# Altium schematic symbol library jlcpcb_2025_04_capacitors_extended_0402.schlib: 3594 symbols (part 3 of 20) (continued)
## 0402N120G500CT
designator C?  Capacitance: 12pF  (hidden comment: *)
Capacitor, Ceramic (MLCC), 12pF, ±2%, 50V, NP0, ±2%, SMD 0402; Manufacturer: Walsin Tech Corp; Manufacturer Part Number: 0402N120G500CT; Package Size: 0402; JLCPCB Basic Part: No; JLCPCB Part Number: C340649; Supplier 1: LCSC; Category: Capacitors - MLCC; Supplier Part Number 1: C340649; Tolerance: ±2%; Voltage Rating: 50V; Temperature Coefficient: NP0; RoHS: Yes; ComponentLink1Description: Datasheet; ComponentLink1URL: https://wmsc.lcsc.com/wmsc/upload/file/pdf/v2/lcsc/2304140030_Walsin-Tech-Corp-0402N120G500CT_C340649.pdf; ComponentLink2Description: JLCPCB Part URL; ComponentLink2URL: https://jlcpcb.com/partdetail/C340649; ComponentLink3Description: LCSC Part URL; ComponentLink3URL: https://lcsc.com/product-detail/Multilayer-Ceramic-Capacitors-MLCC---SMD-SMT_Walsin-Tech-Corp-Walsin-Tech-Corp-0402N120G500CT_C340649.html
footprint CAP-0402 (0402 (1005M) Capacitor)
pins: 1, 2

## 0402N120J500CT
designator C?  Capacitance: 12pF  (hidden comment: *)
Capacitor, Ceramic (MLCC), 12pF, ±5%, 50V, NP0, ±5%, SMD 0402; Manufacturer: Walsin Tech Corp; Manufacturer Part Number: 0402N120J500CT; Package Size: 0402; JLCPCB Basic Part: No; JLCPCB Part Number: C340641; Supplier 1: LCSC; Category: Capacitors - MLCC; Supplier Part Number 1: C340641; Tolerance: ±5%; Voltage Rating: 50V; Temperature Coefficient: NP0; RoHS: Yes; ComponentLink1Description: Datasheet; ComponentLink1URL: https://wmsc.lcsc.com/wmsc/upload/file/pdf/v2/lcsc/2304140030_Walsin-Tech-Corp-0402N120J500CT_C340641.pdf; ComponentLink2Description: JLCPCB Part URL; ComponentLink2URL: https://jlcpcb.com/partdetail/C340641; ComponentLink3Description: LCSC Part URL; ComponentLink3URL: https://lcsc.com/product-detail/Multilayer-Ceramic-Capacitors-MLCC---SMD-SMT_Walsin-Tech-Corp-Walsin-Tech-Corp-0402N120J500CT_C340641.html
footprint CAP-0402 (0402 (1005M) Capacitor)
pins: 1, 2

## 0402N120K500CT
designator C?  Capacitance: 12pF  (hidden comment: *)
Capacitor, Ceramic (MLCC), 12pF, ±10%, 50V, NP0, ±10%, SMD 0402; Manufacturer: Walsin Tech Corp; Manufacturer Part Number: 0402N120K500CT; Package Size: 0402; JLCPCB Basic Part: No; JLCPCB Part Number: C295958; Supplier 1: LCSC; Category: Capacitors - MLCC; Supplier Part Number 1: C295958; Tolerance: ±10%; Voltage Rating: 50V; Temperature Coefficient: NP0; RoHS: Yes; ComponentLink1Description: Datasheet; ComponentLink1URL: https://wmsc.lcsc.com/wmsc/upload/file/pdf/v2/lcsc/2304140030_Walsin-Tech-Corp-0402N120K500CT_C295958.pdf; ComponentLink2Description: JLCPCB Part URL; ComponentLink2URL: https://jlcpcb.com/partdetail/C295958; ComponentLink3Description: LCSC Part URL; ComponentLink3URL: https://lcsc.com/product-detail/Multilayer-Ceramic-Capacitors-MLCC---SMD-SMT_Walsin-Tech-Corp-Walsin-Tech-Corp-0402N120K500CT_C295958.html
footprint CAP-0402 (0402 (1005M) Capacitor)
pins: 1, 2

## 0402N121F500CT
designator C?  Capacitance: 120pF  (hidden comment: *)
Capacitor, Ceramic (MLCC), 120pF, ±1%, 50V, NP0, ±1%, SMD 0402; Manufacturer: Walsin Tech Corp; Manufacturer Part Number: 0402N121F500CT; Package Size: 0402; JLCPCB Basic Part: No; JLCPCB Part Number: C2443241; Supplier 1: LCSC; Category: Capacitors - MLCC; Supplier Part Number 1: C2443241; Tolerance: ±1%; Voltage Rating: 50V; Temperature Coefficient: NP0; RoHS: Yes; ComponentLink1Description: Datasheet; ComponentLink1URL: https://wmsc.lcsc.com/wmsc/upload/file/pdf/v2/lcsc/2309201533_Walsin-Tech-Corp-0402N121F500CT_C2443241.pdf; ComponentLink2Description: JLCPCB Part URL; ComponentLink2URL: https://jlcpcb.com/partdetail/C2443241; ComponentLink3Description: LCSC Part URL; ComponentLink3URL: https://lcsc.com/product-detail/Multilayer-Ceramic-Capacitors-MLCC---SMD-SMT_Walsin-Tech-Corp-Walsin-Tech-Corp-0402N121F500CT_C2443241.html
footprint CAP-0402 (0402 (1005M) Capacitor)
pins: 1, 2

## 0402N121G500CT
designator C?  Capacitance: 120pF  (hidden comment: *)
Capacitor, Ceramic (MLCC), 120pF, ±2%, 50V, NP0, ±2%, SMD 0402; Manufacturer: Walsin Tech Corp; Manufacturer Part Number: 0402N121G500CT; Package Size: 0402; JLCPCB Basic Part: No; JLCPCB Part Number: C396705; Supplier 1: LCSC; Category: Capacitors - MLCC; Supplier Part Number 1: C396705; Tolerance: ±2%; Voltage Rating: 50V; Temperature Coefficient: NP0; RoHS: Yes; ComponentLink1Description: Datasheet; ComponentLink1URL: https://wmsc.lcsc.com/wmsc/upload/file/pdf/v2/lcsc/2304140030_Walsin-Tech-Corp-0402N121G500CT_C396705.pdf; ComponentLink2Description: JLCPCB Part URL; ComponentLink2URL: https://jlcpcb.com/partdetail/C396705; ComponentLink3Description: LCSC Part URL; ComponentLink3URL: https://lcsc.com/product-detail/Multilayer-Ceramic-Capacitors-MLCC---SMD-SMT_Walsin-Tech-Corp-Walsin-Tech-Corp-0402N121G500CT_C396705.html
footprint CAP-0402 (0402 (1005M) Capacitor)
pins: 1, 2

## 0402N121J500CT
designator C?  Capacitance: 120pF  (hidden comment: *)
Capacitor, Ceramic (MLCC), 120pF, ±5%, 50V, NP0, ±5%, SMD 0402; Manufacturer: Walsin Tech Corp; Manufacturer Part Number: 0402N121J500CT; Package Size: 0402; JLCPCB Basic Part: No; JLCPCB Part Number: C237176; Supplier 1: LCSC; Category: Capacitors - MLCC; Supplier Part Number 1: C237176; Tolerance: ±5%; Voltage Rating: 50V; Temperature Coefficient: NP0; RoHS: Yes; ComponentLink1Description: Datasheet; ComponentLink1URL: https://wmsc.lcsc.com/wmsc/upload/file/pdf/v2/lcsc/2304140030_Walsin-Tech-Corp-0402N121J500CT_C237176.pdf; ComponentLink2Description: JLCPCB Part URL; ComponentLink2URL: https://jlcpcb.com/partdetail/C237176; ComponentLink3Description: LCSC Part URL; ComponentLink3URL: https://lcsc.com/product-detail/Multilayer-Ceramic-Capacitors-MLCC---SMD-SMT_Walsin-Tech-Corp-Walsin-Tech-Corp-0402N121J500CT_C237176.html
footprint CAP-0402 (0402 (1005M) Capacitor)
pins: 1, 2

## 0402N130J500CT
designator C?  Capacitance: 13pF  (hidden comment: *)
Capacitor, Ceramic (MLCC), 13pF, ±5%, 50V, NP0, ±5%, SMD 0402; Manufacturer: Walsin Tech Corp; Manufacturer Part Number: 0402N130J500CT; Package Size: 0402; JLCPCB Basic Part: No; JLCPCB Part Number: C301963; Supplier 1: LCSC; Category: Capacitors - MLCC; Supplier Part Number 1: C301963; Tolerance: ±5%; Voltage Rating: 50V; Temperature Coefficient: NP0; RoHS: Yes; ComponentLink1Description: Datasheet; ComponentLink1URL: https://wmsc.lcsc.com/wmsc/upload/file/pdf/v2/lcsc/2304140030_Walsin-Tech-Corp-0402N130J500CT_C301963.pdf; ComponentLink2Description: JLCPCB Part URL; ComponentLink2URL: https://jlcpcb.com/partdetail/C301963; ComponentLink3Description: LCSC Part URL; ComponentLink3URL: https://lcsc.com/product-detail/Multilayer-Ceramic-Capacitors-MLCC---SMD-SMT_Walsin-Tech-Corp-Walsin-Tech-Corp-0402N130J500CT_C301963.html
footprint CAP-0402 (0402 (1005M) Capacitor)
pins: 1, 2

## 0402N140J500CT
designator C?  Capacitance: 14pF  (hidden comment: *)
Capacitor, Ceramic (MLCC), 14pF, ±5%, 50V, NP0, ±5%, SMD 0402; Manufacturer: Walsin Tech Corp; Manufacturer Part Number: 0402N140J500CT; Package Size: 0402; JLCPCB Basic Part: No; JLCPCB Part Number: C458857; Supplier 1: LCSC; Category: Capacitors - MLCC; Supplier Part Number 1: C458857; Tolerance: ±5%; Voltage Rating: 50V; Temperature Coefficient: NP0; RoHS: Yes; ComponentLink1Description: Datasheet; ComponentLink1URL: https://wmsc.lcsc.com/wmsc/upload/file/pdf/v2/lcsc/2304140030_Walsin-Tech-Corp-0402N140J500CT_C458857.pdf; ComponentLink2Description: JLCPCB Part URL; ComponentLink2URL: https://jlcpcb.com/partdetail/C458857; ComponentLink3Description: LCSC Part URL; ComponentLink3URL: https://lcsc.com/product-detail/Multilayer-Ceramic-Capacitors-MLCC---SMD-SMT_Walsin-Tech-Corp-Walsin-Tech-Corp-0402N140J500CT_C458857.html
footprint CAP-0402 (0402 (1005M) Capacitor)
pins: 1, 2

## 0402N150F500CT
designator C?  Capacitance: 15pF  (hidden comment: *)
Capacitor, Ceramic (MLCC), 15pF, ±1%, 50V, NP0, ±1%, SMD 0402; Manufacturer: Walsin Tech Corp; Manufacturer Part Number: 0402N150F500CT; Package Size: 0402; JLCPCB Basic Part: No; JLCPCB Part Number: C396706; Supplier 1: LCSC; Category: Capacitors - MLCC; Supplier Part Number 1: C396706; Tolerance: ±1%; Voltage Rating: 50V; Temperature Coefficient: NP0; RoHS: Yes; ComponentLink1Description: Datasheet; ComponentLink1URL: https://wmsc.lcsc.com/wmsc/upload/file/pdf/v2/lcsc/2304140030_Walsin-Tech-Corp-0402N150F500CT_C396706.pdf; ComponentLink2Description: JLCPCB Part URL; ComponentLink2URL: https://jlcpcb.com/partdetail/C396706; ComponentLink3Description: LCSC Part URL; ComponentLink3URL: https://lcsc.com/product-detail/Multilayer-Ceramic-Capacitors-MLCC---SMD-SMT_Walsin-Tech-Corp-Walsin-Tech-Corp-0402N150F500CT_C396706.html
footprint CAP-0402 (0402 (1005M) Capacitor)
pins: 1, 2

## 0402N150G500CT
designator C?  Capacitance: 15pF  (hidden comment: *)
Capacitor, Ceramic (MLCC), 15pF, ±2%, 50V, NP0, ±2%, SMD 0402; Manufacturer: Walsin Tech Corp; Manufacturer Part Number: 0402N150G500CT; Package Size: 0402; JLCPCB Basic Part: No; JLCPCB Part Number: C387970; Supplier 1: LCSC; Category: Capacitors - MLCC; Supplier Part Number 1: C387970; Tolerance: ±2%; Voltage Rating: 50V; Temperature Coefficient: NP0; RoHS: Yes; ComponentLink1Description: Datasheet; ComponentLink1URL: https://wmsc.lcsc.com/wmsc/upload/file/pdf/v2/lcsc/2304140030_Walsin-Tech-Corp-0402N150G500CT_C387970.pdf; ComponentLink2Description: JLCPCB Part URL; ComponentLink2URL: https://jlcpcb.com/partdetail/C387970; ComponentLink3Description: LCSC Part URL; ComponentLink3URL: https://lcsc.com/product-detail/Multilayer-Ceramic-Capacitors-MLCC---SMD-SMT_Walsin-Tech-Corp-Walsin-Tech-Corp-0402N150G500CT_C387970.html
footprint CAP-0402 (0402 (1005M) Capacitor)
pins: 1, 2

## 0402N150J500CT
designator C?  Capacitance: 15pF  (hidden comment: *)
Capacitor, Ceramic (MLCC), 15pF, ±5%, 50V, NP0, ±5%, SMD 0402; Manufacturer: Walsin Tech Corp; Manufacturer Part Number: 0402N150J500CT; Package Size: 0402; JLCPCB Basic Part: No; JLCPCB Part Number: C387971; Supplier 1: LCSC; Category: Capacitors - MLCC; Supplier Part Number 1: C387971; Tolerance: ±5%; Voltage Rating: 50V; Temperature Coefficient: NP0; RoHS: Yes; ComponentLink1Description: Datasheet; ComponentLink1URL: https://wmsc.lcsc.com/wmsc/upload/file/pdf/v2/lcsc/2304140030_Walsin-Tech-Corp-0402N150J500CT_C387971.pdf; ComponentLink2Description: JLCPCB Part URL; ComponentLink2URL: https://jlcpcb.com/partdetail/C387971; ComponentLink3Description: LCSC Part URL; ComponentLink3URL: https://lcsc.com/product-detail/Multilayer-Ceramic-Capacitors-MLCC---SMD-SMT_Walsin-Tech-Corp-Walsin-Tech-Corp-0402N150J500CT_C387971.html
footprint CAP-0402 (0402 (1005M) Capacitor)
pins: 1, 2

## 0402N150K500CT
designator C?  Capacitance: 15pF  (hidden comment: *)
Capacitor, Ceramic (MLCC), 15pF, ±10%, 50V, NP0, ±10%, SMD 0402; Manufacturer: Walsin Tech Corp; Manufacturer Part Number: 0402N150K500CT; Package Size: 0402; JLCPCB Basic Part: No; JLCPCB Part Number: C295959; Supplier 1: LCSC; Category: Capacitors - MLCC; Supplier Part Number 1: C295959; Tolerance: ±10%; Voltage Rating: 50V; Temperature Coefficient: NP0; RoHS: Yes; ComponentLink1Description: Datasheet; ComponentLink1URL: https://wmsc.lcsc.com/wmsc/upload/file/pdf/v2/lcsc/2304140030_Walsin-Tech-Corp-0402N150K500CT_C295959.pdf; ComponentLink2Description: JLCPCB Part URL; ComponentLink2URL: https://jlcpcb.com/partdetail/C295959; ComponentLink3Description: LCSC Part URL; ComponentLink3URL: https://lcsc.com/product-detail/Multilayer-Ceramic-Capacitors-MLCC---SMD-SMT_Walsin-Tech-Corp-Walsin-Tech-Corp-0402N150K500CT_C295959.html
footprint CAP-0402 (0402 (1005M) Capacitor)
pins: 1, 2

## 0402N151J500CT
designator C?  Capacitance: 150pF  (hidden comment: *)
Capacitor, Ceramic (MLCC), 150pF, ±5%, 50V, NP0, ±5%, SMD 0402; Manufacturer: Walsin Tech Corp; Manufacturer Part Number: 0402N151J500CT; Package Size: 0402; JLCPCB Basic Part: No; JLCPCB Part Number: C301964; Supplier 1: LCSC; Category: Capacitors - MLCC; Supplier Part Number 1: C301964; Tolerance: ±5%; Voltage Rating: 50V; Temperature Coefficient: NP0; RoHS: Yes; ComponentLink1Description: Datasheet; ComponentLink1URL: https://wmsc.lcsc.com/wmsc/upload/file/pdf/v2/lcsc/2304140030_Walsin-Tech-Corp-0402N151J500CT_C301964.pdf; ComponentLink2Description: JLCPCB Part URL; ComponentLink2URL: https://jlcpcb.com/partdetail/C301964; ComponentLink3Description: LCSC Part URL; ComponentLink3URL: https://lcsc.com/product-detail/Multilayer-Ceramic-Capacitors-MLCC---SMD-SMT_Walsin-Tech-Corp-Walsin-Tech-Corp-0402N151J500CT_C301964.html
footprint CAP-0402 (0402 (1005M) Capacitor)
pins: 1, 2

## 0402N151K500CT
designator C?  Capacitance: 150pF  (hidden comment: *)
Capacitor, Ceramic (MLCC), 150pF, ±10%, 50V, NP0, ±10%, SMD 0402; Manufacturer: Walsin Tech Corp; Manufacturer Part Number: 0402N151K500CT; Package Size: 0402; JLCPCB Basic Part: No; JLCPCB Part Number: C295960; Supplier 1: LCSC; Category: Capacitors - MLCC; Supplier Part Number 1: C295960; Tolerance: ±10%; Voltage Rating: 50V; Temperature Coefficient: NP0; RoHS: Yes; ComponentLink1Description: Datasheet; ComponentLink1URL: https://wmsc.lcsc.com/wmsc/upload/file/pdf/v2/lcsc/2304140030_Walsin-Tech-Corp-0402N151K500CT_C295960.pdf; ComponentLink2Description: JLCPCB Part URL; ComponentLink2URL: https://jlcpcb.com/partdetail/C295960; ComponentLink3Description: LCSC Part URL; ComponentLink3URL: https://lcsc.com/product-detail/Multilayer-Ceramic-Capacitors-MLCC---SMD-SMT_Walsin-Tech-Corp-Walsin-Tech-Corp-0402N151K500CT_C295960.html
footprint CAP-0402 (0402 (1005M) Capacitor)
pins: 1, 2

## 0402N160J500CT
designator C?  Capacitance: 16pF  (hidden comment: *)
Capacitor, Ceramic (MLCC), 16pF, ±5%, 50V, NP0, ±5%, SMD 0402; Manufacturer: Walsin Tech Corp; Manufacturer Part Number: 0402N160J500CT; Package Size: 0402; JLCPCB Basic Part: No; JLCPCB Part Number: C237184; Supplier 1: LCSC; Category: Capacitors - MLCC; Supplier Part Number 1: C237184; Tolerance: ±5%; Voltage Rating: 50V; Temperature Coefficient: NP0; RoHS: Yes; ComponentLink1Description: Datasheet; ComponentLink1URL: https://wmsc.lcsc.com/wmsc/upload/file/pdf/v2/lcsc/2304140030_Walsin-Tech-Corp-0402N160J500CT_C237184.pdf; ComponentLink2Description: JLCPCB Part URL; ComponentLink2URL: https://jlcpcb.com/partdetail/C237184; ComponentLink3Description: LCSC Part URL; ComponentLink3URL: https://lcsc.com/product-detail/Multilayer-Ceramic-Capacitors-MLCC---SMD-SMT_Walsin-Tech-Corp-Walsin-Tech-Corp-0402N160J500CT_C237184.html
footprint CAP-0402 (0402 (1005M) Capacitor)
pins: 1, 2

## 0402N161J500
designator C?  Capacitance: 160pF  (hidden comment: *)
Capacitor, Ceramic (MLCC), 160pF, ±5%, 50V, NP0, ±5%, SMD 0402; Manufacturer: Walsin Tech Corp; Manufacturer Part Number: 0402N161J500; Package Size: 0402; JLCPCB Basic Part: No; JLCPCB Part Number: C152786; Supplier 1: LCSC; Category: Capacitors - MLCC; Supplier Part Number 1: C152786; Tolerance: ±5%; Voltage Rating: 50V; Temperature Coefficient: NP0; RoHS: Yes; ComponentLink1Description: Datasheet; ComponentLink1URL: https://wmsc.lcsc.com/wmsc/upload/file/pdf/v2/lcsc/2304140030_Walsin-Tech-Corp-0402N161J500_C152786.pdf; ComponentLink2Description: JLCPCB Part URL; ComponentLink2URL: https://jlcpcb.com/partdetail/C152786; ComponentLink3Description: LCSC Part URL; ComponentLink3URL: https://lcsc.com/product-detail/Multilayer-Ceramic-Capacitors-MLCC---SMD-SMT_Walsin-Tech-Corp-Walsin-Tech-Corp-0402N161J500_C152786.html
footprint CAP-0402 (0402 (1005M) Capacitor)
pins: 1, 2

## 0402N180G500CT
designator C?  Capacitance: 18pF  (hidden comment: *)
Capacitor, Ceramic (MLCC), 18pF, ±2%, 50V, NP0, ±2%, SMD 0402; Manufacturer: Walsin Tech Corp; Manufacturer Part Number: 0402N180G500CT; Package Size: 0402; JLCPCB Basic Part: No; JLCPCB Part Number: C555395; Supplier 1: LCSC; Category: Capacitors - MLCC; Supplier Part Number 1: C555395; Tolerance: ±2%; Voltage Rating: 50V; Temperature Coefficient: NP0; RoHS: Yes; ComponentLink1Description: Datasheet; ComponentLink1URL: https://wmsc.lcsc.com/wmsc/upload/file/pdf/v2/lcsc/2304140030_Walsin-Tech-Corp-0402N180G500CT_C555395.pdf; ComponentLink2Description: JLCPCB Part URL; ComponentLink2URL: https://jlcpcb.com/partdetail/C555395; ComponentLink3Description: LCSC Part URL; ComponentLink3URL: https://lcsc.com/product-detail/Multilayer-Ceramic-Capacitors-MLCC---SMD-SMT_Walsin-Tech-Corp-Walsin-Tech-Corp-0402N180G500CT_C555395.html
footprint CAP-0402 (0402 (1005M) Capacitor)
pins: 1, 2

## 0402N180J500CT
designator C?  Capacitance: 18pF  (hidden comment: *)
Capacitor, Ceramic (MLCC), 18pF, ±5%, 50V, NP0, ±5%, SMD 0402; Manufacturer: Walsin Tech Corp; Manufacturer Part Number: 0402N180J500CT; Package Size: 0402; JLCPCB Basic Part: No; JLCPCB Part Number: C338135; Supplier 1: LCSC; Category: Capacitors - MLCC; Supplier Part Number 1: C338135; Tolerance: ±5%; Voltage Rating: 50V; Temperature Coefficient: NP0; RoHS: Yes; ComponentLink1Description: Datasheet; ComponentLink1URL: https://wmsc.lcsc.com/wmsc/upload/file/pdf/v2/lcsc/2304140030_Walsin-Tech-Corp-0402N180J500CT_C338135.pdf; ComponentLink2Description: JLCPCB Part URL; ComponentLink2URL: https://jlcpcb.com/partdetail/C338135; ComponentLink3Description: LCSC Part URL; ComponentLink3URL: https://lcsc.com/product-detail/Multilayer-Ceramic-Capacitors-MLCC---SMD-SMT_Walsin-Tech-Corp-Walsin-Tech-Corp-0402N180J500CT_C338135.html
footprint CAP-0402 (0402 (1005M) Capacitor)
pins: 1, 2

## 0402N180K500CT
designator C?  Capacitance: 18pF  (hidden comment: *)
Capacitor, Ceramic (MLCC), 18pF, ±10%, 50V, NP0, ±10%, SMD 0402; Manufacturer: Walsin Tech Corp; Manufacturer Part Number: 0402N180K500CT; Package Size: 0402; JLCPCB Basic Part: No; JLCPCB Part Number: C295961; Supplier 1: LCSC; Category: Capacitors - MLCC; Supplier Part Number 1: C295961; Tolerance: ±10%; Voltage Rating: 50V; Temperature Coefficient: NP0; RoHS: Yes; ComponentLink1Description: Datasheet; ComponentLink1URL: https://wmsc.lcsc.com/wmsc/upload/file/pdf/v2/lcsc/2304140030_Walsin-Tech-Corp-0402N180K500CT_C295961.pdf; ComponentLink2Description: JLCPCB Part URL; ComponentLink2URL: https://jlcpcb.com/partdetail/C295961; ComponentLink3Description: LCSC Part URL; ComponentLink3URL: https://lcsc.com/product-detail/Multilayer-Ceramic-Capacitors-MLCC---SMD-SMT_Walsin-Tech-Corp-Walsin-Tech-Corp-0402N180K500CT_C295961.html
footprint CAP-0402 (0402 (1005M) Capacitor)
pins: 1, 2

## 0402N181F500CT
designator C?  Capacitance: 180pF  (hidden comment: *)
Capacitor, Ceramic (MLCC), 180pF, ±1%, 50V, NP0, ±1%, SMD 0402; Manufacturer: Walsin Tech Corp; Manufacturer Part Number: 0402N181F500CT; Package Size: 0402; JLCPCB Basic Part: No; JLCPCB Part Number: C387973; Supplier 1: LCSC; Category: Capacitors - MLCC; Supplier Part Number 1: C387973; Tolerance: ±1%; Voltage Rating: 50V; Temperature Coefficient: NP0; RoHS: Yes; ComponentLink1Description: Datasheet; ComponentLink1URL: https://wmsc.lcsc.com/wmsc/upload/file/pdf/v2/lcsc/2304140030_Walsin-Tech-Corp-0402N181F500CT_C387973.pdf; ComponentLink2Description: JLCPCB Part URL; ComponentLink2URL: https://jlcpcb.com/partdetail/C387973; ComponentLink3Description: LCSC Part URL; ComponentLink3URL: https://lcsc.com/product-detail/Multilayer-Ceramic-Capacitors-MLCC---SMD-SMT_Walsin-Tech-Corp-Walsin-Tech-Corp-0402N181F500CT_C387973.html
footprint CAP-0402 (0402 (1005M) Capacitor)
pins: 1, 2

## 0402N181K500CT
designator C?  Capacitance: 180pF  (hidden comment: *)
Capacitor, Ceramic (MLCC), 180pF, ±10%, 50V, NP0, ±10%, SMD 0402; Manufacturer: Walsin Tech Corp; Manufacturer Part Number: 0402N181K500CT; Package Size: 0402; JLCPCB Basic Part: No; JLCPCB Part Number: C295963; Supplier 1: LCSC; Category: Capacitors - MLCC; Supplier Part Number 1: C295963; Tolerance: ±10%; Voltage Rating: 50V; Temperature Coefficient: NP0; RoHS: Yes; ComponentLink1Description: Datasheet; ComponentLink1URL: https://wmsc.lcsc.com/wmsc/upload/file/pdf/v2/lcsc/2304140030_Walsin-Tech-Corp-0402N181K500CT_C295963.pdf; ComponentLink2Description: JLCPCB Part URL; ComponentLink2URL: https://jlcpcb.com/partdetail/C295963; ComponentLink3Description: LCSC Part URL; ComponentLink3URL: https://lcsc.com/product-detail/Multilayer-Ceramic-Capacitors-MLCC---SMD-SMT_Walsin-Tech-Corp-Walsin-Tech-Corp-0402N181K500CT_C295963.html
footprint CAP-0402 (0402 (1005M) Capacitor)
pins: 1, 2

## 0402N200F500CT
designator C?  Capacitance: 20pF  (hidden comment: *)
Capacitor, Ceramic (MLCC), 20pF, ±1%, 50V, NP0, ±1%, SMD 0402; Manufacturer: Walsin Tech Corp; Manufacturer Part Number: 0402N200F500CT; Package Size: 0402; JLCPCB Basic Part: No; JLCPCB Part Number: C295965; Supplier 1: LCSC; Category: Capacitors - MLCC; Supplier Part Number 1: C295965; Tolerance: ±1%; Voltage Rating: 50V; Temperature Coefficient: NP0; RoHS: Yes; ComponentLink1Description: Datasheet; ComponentLink1URL: https://wmsc.lcsc.com/wmsc/upload/file/pdf/v2/lcsc/2304140030_Walsin-Tech-Corp-0402N200F500CT_C295965.pdf; ComponentLink2Description: JLCPCB Part URL; ComponentLink2URL: https://jlcpcb.com/partdetail/C295965; ComponentLink3Description: LCSC Part URL; ComponentLink3URL: https://lcsc.com/product-detail/Multilayer-Ceramic-Capacitors-MLCC---SMD-SMT_Walsin-Tech-Corp-Walsin-Tech-Corp-0402N200F500CT_C295965.html
footprint CAP-0402 (0402 (1005M) Capacitor)
pins: 1, 2

## 0402N200G500CT
designator C?  Capacitance: 20pF  (hidden comment: *)
Capacitor, Ceramic (MLCC), 20pF, ±2%, 50V, NP0, ±2%, SMD 0402; Manufacturer: Walsin Tech Corp; Manufacturer Part Number: 0402N200G500CT; Package Size: 0402; JLCPCB Basic Part: No; JLCPCB Part Number: C469636; Supplier 1: LCSC; Category: Capacitors - MLCC; Supplier Part Number 1: C469636; Tolerance: ±2%; Voltage Rating: 50V; Temperature Coefficient: NP0; RoHS: Yes; ComponentLink1Description: Datasheet; ComponentLink1URL: https://wmsc.lcsc.com/wmsc/upload/file/pdf/v2/lcsc/2304140030_Walsin-Tech-Corp-0402N200G500CT_C469636.pdf; ComponentLink2Description: JLCPCB Part URL; ComponentLink2URL: https://jlcpcb.com/partdetail/C469636; ComponentLink3Description: LCSC Part URL; ComponentLink3URL: https://lcsc.com/product-detail/Multilayer-Ceramic-Capacitors-MLCC---SMD-SMT_Walsin-Tech-Corp-Walsin-Tech-Corp-0402N200G500CT_C469636.html
footprint CAP-0402 (0402 (1005M) Capacitor)
pins: 1, 2

## 0402N200J500CT
designator C?  Capacitance: 20pF  (hidden comment: *)
Capacitor, Ceramic (MLCC), 20pF, ±5%, 50V, NP0, ±5%, SMD 0402; Manufacturer: Walsin Tech Corp; Manufacturer Part Number: 0402N200J500CT; Package Size: 0402; JLCPCB Basic Part: No; JLCPCB Part Number: C123468; Supplier 1: LCSC; Category: Capacitors - MLCC; Supplier Part Number 1: C123468; Tolerance: ±5%; Voltage Rating: 50V; Temperature Coefficient: NP0; RoHS: Yes; ComponentLink1Description: Datasheet; ComponentLink1URL: https://wmsc.lcsc.com/wmsc/upload/file/pdf/v2/lcsc/2304140030_Walsin-Tech-Corp-0402N200J500CT_C123468.pdf; ComponentLink2Description: JLCPCB Part URL; ComponentLink2URL: https://jlcpcb.com/partdetail/C123468; ComponentLink3Description: LCSC Part URL; ComponentLink3URL: https://lcsc.com/product-detail/Multilayer-Ceramic-Capacitors-MLCC---SMD-SMT_Walsin-Tech-Corp-Walsin-Tech-Corp-0402N200J500CT_C123468.html
footprint CAP-0402 (0402 (1005M) Capacitor)
pins: 1, 2

## 0402N201F500CT
designator C?  Capacitance: 200pF  (hidden comment: *)
Capacitor, Ceramic (MLCC), 200pF, ±1%, 50V, NP0, ±1%, SMD 0402; Manufacturer: Walsin Tech Corp; Manufacturer Part Number: 0402N201F500CT; Package Size: 0402; JLCPCB Basic Part: No; JLCPCB Part Number: C301972; Supplier 1: LCSC; Category: Capacitors - MLCC; Supplier Part Number 1: C301972; Tolerance: ±1%; Voltage Rating: 50V; Temperature Coefficient: NP0; RoHS: Yes; ComponentLink1Description: Datasheet; ComponentLink1URL: https://wmsc.lcsc.com/wmsc/upload/file/pdf/v2/lcsc/2304140030_Walsin-Tech-Corp-0402N201F500CT_C301972.pdf; ComponentLink2Description: JLCPCB Part URL; ComponentLink2URL: https://jlcpcb.com/partdetail/C301972; ComponentLink3Description: LCSC Part URL; ComponentLink3URL: https://lcsc.com/product-detail/Multilayer-Ceramic-Capacitors-MLCC---SMD-SMT_Walsin-Tech-Corp-Walsin-Tech-Corp-0402N201F500CT_C301972.html
footprint CAP-0402 (0402 (1005M) Capacitor)
pins: 1, 2

## 0402N201J500CT
designator C?  Capacitance: 200pF  (hidden comment: *)
Capacitor, Ceramic (MLCC), 200pF, ±5%, 50V, NP0, ±5%, SMD 0402; Manufacturer: Walsin Tech Corp; Manufacturer Part Number: 0402N201J500CT; Package Size: 0402; JLCPCB Basic Part: No; JLCPCB Part Number: C295967; Supplier 1: LCSC; Category: Capacitors - MLCC; Supplier Part Number 1: C295967; Tolerance: ±5%; Voltage Rating: 50V; Temperature Coefficient: NP0; RoHS: Yes; ComponentLink1Description: Datasheet; ComponentLink1URL: https://wmsc.lcsc.com/wmsc/upload/file/pdf/v2/lcsc/2304140030_Walsin-Tech-Corp-0402N201J500CT_C295967.pdf; ComponentLink2Description: JLCPCB Part URL; ComponentLink2URL: https://jlcpcb.com/partdetail/C295967; ComponentLink3Description: LCSC Part URL; ComponentLink3URL: https://lcsc.com/product-detail/Multilayer-Ceramic-Capacitors-MLCC---SMD-SMT_Walsin-Tech-Corp-Walsin-Tech-Corp-0402N201J500CT_C295967.html
footprint CAP-0402 (0402 (1005M) Capacitor)
pins: 1, 2

## 0402N201J500CT-C
designator C?  Capacitance: 200pF  (hidden comment: *)
Capacitor, Ceramic (MLCC), 200pF, ±5%, 50V, NP0, ±5%, SMD 0402; Manufacturer: Walsin Tech Corp; Manufacturer Part Number: 0402N201J500CT-C; Package Size: 0402; JLCPCB Basic Part: No; JLCPCB Part Number: C2991445; Supplier 1: LCSC; Category: Capacitors - MLCC; Supplier Part Number 1: C2991445; Tolerance: ±5%; Voltage Rating: 50V; Temperature Coefficient: NP0; RoHS: Yes; ComponentLink1Description: Datasheet; ComponentLink1URL: https://wmsc.lcsc.com/wmsc/upload/file/pdf/v2/lcsc/2204131745_Walsin-Tech-Corp-0402N201J500CT-C_C2991445.pdf; ComponentLink2Description: JLCPCB Part URL; ComponentLink2URL: https://jlcpcb.com/partdetail/C2991445; ComponentLink3Description: LCSC Part URL; ComponentLink3URL: https://lcsc.com/product-detail/Multilayer-Ceramic-Capacitors-MLCC---SMD-SMT_Walsin-Tech-Corp-Walsin-Tech-Corp-0402N201J500CT-C_C2991445.html
footprint CAP-0402 (0402 (1005M) Capacitor)
pins: 1, 2

## 0402N220F101CT
designator C?  Capacitance: 22pF  (hidden comment: *)
Capacitor, Ceramic (MLCC), 22pF, ±1%, 100V, NP0, ±1%, SMD 0402; Manufacturer: Walsin Tech Corp; Manufacturer Part Number: 0402N220F101CT; Package Size: 0402; JLCPCB Basic Part: No; JLCPCB Part Number: C3846574; Supplier 1: LCSC; Category: Capacitors - MLCC; Supplier Part Number 1: C3846574; Tolerance: ±1%; Voltage Rating: 100V; Temperature Coefficient: NP0; RoHS: Yes; ComponentLink1Description: Datasheet; ComponentLink1URL: https://wmsc.lcsc.com/wmsc/upload/file/pdf/v2/lcsc/2309201534_Walsin-Tech-Corp-0402N220F101CT_C3846574.pdf; ComponentLink2Description: JLCPCB Part URL; ComponentLink2URL: https://jlcpcb.com/partdetail/C3846574; ComponentLink3Description: LCSC Part URL; ComponentLink3URL: https://lcsc.com/product-detail/Multilayer-Ceramic-Capacitors-MLCC---SMD-SMT_Walsin-Tech-Corp-Walsin-Tech-Corp-0402N220F101CT_C3846574.html
footprint CAP-0402 (0402 (1005M) Capacitor)
pins: 1, 2

## 0402N220F500CT
designator C?  Capacitance: 22pF  (hidden comment: *)
Capacitor, Ceramic (MLCC), 22pF, ±1%, 50V, NP0, ±1%, SMD 0402; Manufacturer: Walsin Tech Corp; Manufacturer Part Number: 0402N220F500CT; Package Size: 0402; JLCPCB Basic Part: No; JLCPCB Part Number: C295968; Supplier 1: LCSC; Category: Capacitors - MLCC; Supplier Part Number 1: C295968; Tolerance: ±1%; Voltage Rating: 50V; Temperature Coefficient: NP0; RoHS: Yes; ComponentLink1Description: Datasheet; ComponentLink1URL: https://wmsc.lcsc.com/wmsc/upload/file/pdf/v2/lcsc/2304140030_Walsin-Tech-Corp-0402N220F500CT_C295968.pdf; ComponentLink2Description: JLCPCB Part URL; ComponentLink2URL: https://jlcpcb.com/partdetail/C295968; ComponentLink3Description: LCSC Part URL; ComponentLink3URL: https://lcsc.com/product-detail/Multilayer-Ceramic-Capacitors-MLCC---SMD-SMT_Walsin-Tech-Corp-Walsin-Tech-Corp-0402N220F500CT_C295968.html
footprint CAP-0402 (0402 (1005M) Capacitor)
pins: 1, 2

## 0402N220G500CT
designator C?  Capacitance: 22pF  (hidden comment: *)
Capacitor, Ceramic (MLCC), 22pF, ±2%, 50V, NP0, ±2%, SMD 0402; Manufacturer: Walsin Tech Corp; Manufacturer Part Number: 0402N220G500CT; Package Size: 0402; JLCPCB Basic Part: No; JLCPCB Part Number: C384802; Supplier 1: LCSC; Category: Capacitors - MLCC; Supplier Part Number 1: C384802; Tolerance: ±2%; Voltage Rating: 50V; Temperature Coefficient: NP0; RoHS: Yes; ComponentLink1Description: Datasheet; ComponentLink1URL: https://wmsc.lcsc.com/wmsc/upload/file/pdf/v2/lcsc/2304140030_Walsin-Tech-Corp-0402N220G500CT_C384802.pdf; ComponentLink2Description: JLCPCB Part URL; ComponentLink2URL: https://jlcpcb.com/partdetail/C384802; ComponentLink3Description: LCSC Part URL; ComponentLink3URL: https://lcsc.com/product-detail/Multilayer-Ceramic-Capacitors-MLCC---SMD-SMT_Walsin-Tech-Corp-Walsin-Tech-Corp-0402N220G500CT_C384802.html
footprint CAP-0402 (0402 (1005M) Capacitor)
pins: 1, 2

## 0402N220J101CT
designator C?  Capacitance: 22pF  (hidden comment: *)
Capacitor, Ceramic (MLCC), 22pF, ±5%, 100V, NP0, ±5%, SMD 0402; Manufacturer: Walsin Tech Corp; Manufacturer Part Number: 0402N220J101CT; Package Size: 0402; JLCPCB Basic Part: No; JLCPCB Part Number: C525496; Supplier 1: LCSC; Category: Capacitors - MLCC; Supplier Part Number 1: C525496; Tolerance: ±5%; Voltage Rating: 100V; Temperature Coefficient: NP0; RoHS: Yes; ComponentLink1Description: Datasheet; ComponentLink1URL: https://wmsc.lcsc.com/wmsc/upload/file/pdf/v2/lcsc/2304140030_Walsin-Tech-Corp-0402N220J101CT_C525496.pdf; ComponentLink2Description: JLCPCB Part URL; ComponentLink2URL: https://jlcpcb.com/partdetail/C525496; ComponentLink3Description: LCSC Part URL; ComponentLink3URL: https://lcsc.com/product-detail/Multilayer-Ceramic-Capacitors-MLCC---SMD-SMT_Walsin-Tech-Corp-Walsin-Tech-Corp-0402N220J101CT_C525496.html
footprint CAP-0402 (0402 (1005M) Capacitor)
pins: 1, 2

## 0402N220J250CT
designator C?  Capacitance: 22pF  (hidden comment: *)
Capacitor, Ceramic (MLCC), 22pF, ±5%, 25V, NP0, ±5%, SMD 0402; Manufacturer: Walsin Tech Corp; Manufacturer Part Number: 0402N220J250CT; Package Size: 0402; JLCPCB Basic Part: No; JLCPCB Part Number: C908480; Supplier 1: LCSC; Category: Capacitors - MLCC; Supplier Part Number 1: C908480; Tolerance: ±5%; Voltage Rating: 25V; Temperature Coefficient: NP0; RoHS: Yes; ComponentLink1Description: Datasheet; ComponentLink1URL: https://wmsc.lcsc.com/wmsc/upload/file/pdf/v2/lcsc/2010271806_Walsin-Tech-Corp-0402N220J250CT_C908480.pdf; ComponentLink2Description: JLCPCB Part URL; ComponentLink2URL: https://jlcpcb.com/partdetail/C908480; ComponentLink3Description: LCSC Part URL; ComponentLink3URL: https://lcsc.com/product-detail/Multilayer-Ceramic-Capacitors-MLCC---SMD-SMT_Walsin-Tech-Corp-Walsin-Tech-Corp-0402N220J250CT_C908480.html
footprint CAP-0402 (0402 (1005M) Capacitor)
pins: 1, 2

## 0402N220J500CT
designator C?  Capacitance: 22pF  (hidden comment: *)
Capacitor, Ceramic (MLCC), 22pF, ±5%, 50V, NP0, ±5%, SMD 0402; Manufacturer: Walsin Tech Corp; Manufacturer Part Number: 0402N220J500CT; Package Size: 0402; JLCPCB Basic Part: No; JLCPCB Part Number: C338129; Supplier 1: LCSC; Category: Capacitors - MLCC; Supplier Part Number 1: C338129; Tolerance: ±5%; Voltage Rating: 50V; Temperature Coefficient: NP0; RoHS: Yes; ComponentLink1Description: Datasheet; ComponentLink1URL: https://wmsc.lcsc.com/wmsc/upload/file/pdf/v2/lcsc/2304140030_Walsin-Tech-Corp-0402N220J500CT_C338129.pdf; ComponentLink2Description: JLCPCB Part URL; ComponentLink2URL: https://jlcpcb.com/partdetail/C338129; ComponentLink3Description: LCSC Part URL; ComponentLink3URL: https://lcsc.com/product-detail/Multilayer-Ceramic-Capacitors-MLCC---SMD-SMT_Walsin-Tech-Corp-Walsin-Tech-Corp-0402N220J500CT_C338129.html
footprint CAP-0402 (0402 (1005M) Capacitor)
pins: 1, 2

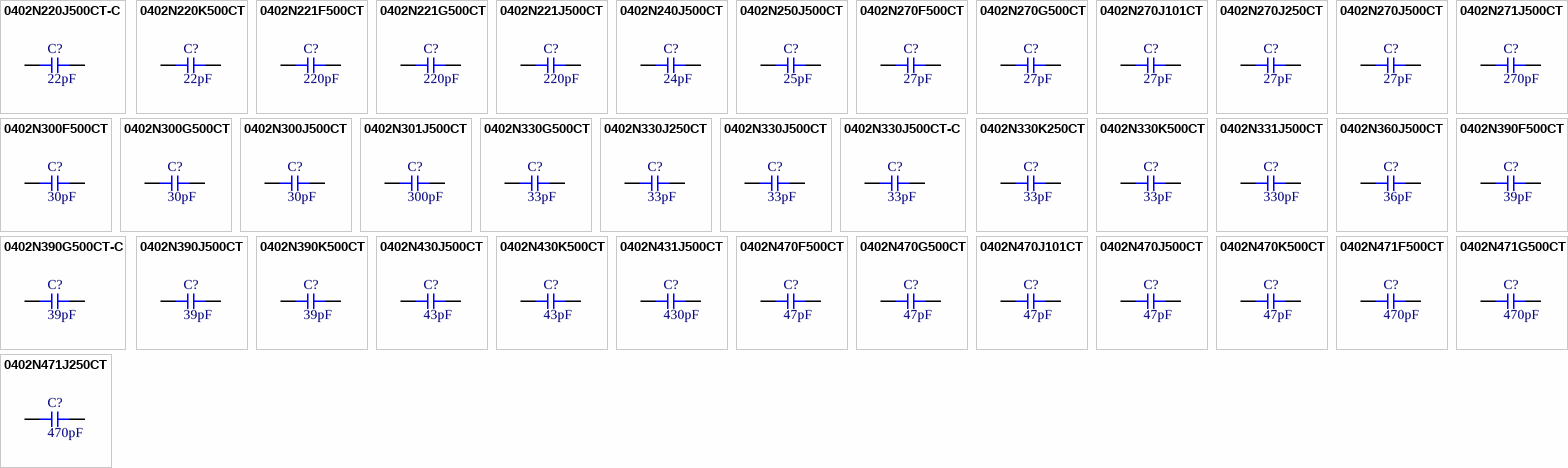
[diagram p12: symbols 0402N220J500CT-C to 0402N471J250CT]

## 0402N220J500CT-C
designator C?  Capacitance: 22pF  (hidden comment: *)
Capacitor, Ceramic (MLCC), 22pF, ±5%, 50V, NP0, ±5%, SMD 0402; Manufacturer: Walsin Tech Corp; Manufacturer Part Number: 0402N220J500CT-C; Package Size: 0402; JLCPCB Basic Part: No; JLCPCB Part Number: C2991490; Supplier 1: LCSC; Category: Capacitors - MLCC; Supplier Part Number 1: C2991490; Tolerance: ±5%; Voltage Rating: 50V; Temperature Coefficient: NP0; RoHS: Yes; ComponentLink1Description: Datasheet; ComponentLink1URL: https://wmsc.lcsc.com/wmsc/upload/file/pdf/v2/lcsc/2204131745_Walsin-Tech-Corp-0402N220J500CT-C_C2991490.pdf; ComponentLink2Description: JLCPCB Part URL; ComponentLink2URL: https://jlcpcb.com/partdetail/C2991490; ComponentLink3Description: LCSC Part URL; ComponentLink3URL: https://lcsc.com/product-detail/Multilayer-Ceramic-Capacitors-MLCC---SMD-SMT_Walsin-Tech-Corp-Walsin-Tech-Corp-0402N220J500CT-C_C2991490.html
footprint CAP-0402 (0402 (1005M) Capacitor)
pins: 1, 2

## 0402N220K500CT
designator C?  Capacitance: 22pF  (hidden comment: *)
Capacitor, Ceramic (MLCC), 22pF, ±10%, 50V, NP0, ±10%, SMD 0402; Manufacturer: Walsin Tech Corp; Manufacturer Part Number: 0402N220K500CT; Package Size: 0402; JLCPCB Basic Part: No; JLCPCB Part Number: C295969; Supplier 1: LCSC; Category: Capacitors - MLCC; Supplier Part Number 1: C295969; Tolerance: ±10%; Voltage Rating: 50V; Temperature Coefficient: NP0; RoHS: Yes; ComponentLink1Description: Datasheet; ComponentLink1URL: https://wmsc.lcsc.com/wmsc/upload/file/pdf/v2/lcsc/2304140030_Walsin-Tech-Corp-0402N220K500CT_C295969.pdf; ComponentLink2Description: JLCPCB Part URL; ComponentLink2URL: https://jlcpcb.com/partdetail/C295969; ComponentLink3Description: LCSC Part URL; ComponentLink3URL: https://lcsc.com/product-detail/Multilayer-Ceramic-Capacitors-MLCC---SMD-SMT_Walsin-Tech-Corp-Walsin-Tech-Corp-0402N220K500CT_C295969.html
footprint CAP-0402 (0402 (1005M) Capacitor)
pins: 1, 2

## 0402N221F500CT
designator C?  Capacitance: 220pF  (hidden comment: *)
Capacitor, Ceramic (MLCC), 220pF, ±1%, 50V, NP0, ±1%, SMD 0402; Manufacturer: Walsin Tech Corp; Manufacturer Part Number: 0402N221F500CT; Package Size: 0402; JLCPCB Basic Part: No; JLCPCB Part Number: C880886; Supplier 1: LCSC; Category: Capacitors - MLCC; Supplier Part Number 1: C880886; Tolerance: ±1%; Voltage Rating: 50V; Temperature Coefficient: NP0; RoHS: Yes; ComponentLink1Description: Datasheet; ComponentLink1URL: https://wmsc.lcsc.com/wmsc/upload/file/pdf/v2/lcsc/2304140030_Walsin-Tech-Corp-0402N221F500CT_C880886.pdf; ComponentLink2Description: JLCPCB Part URL; ComponentLink2URL: https://jlcpcb.com/partdetail/C880886; ComponentLink3Description: LCSC Part URL; ComponentLink3URL: https://lcsc.com/product-detail/Multilayer-Ceramic-Capacitors-MLCC---SMD-SMT_Walsin-Tech-Corp-Walsin-Tech-Corp-0402N221F500CT_C880886.html
footprint CAP-0402 (0402 (1005M) Capacitor)
pins: 1, 2

## 0402N221G500CT
designator C?  Capacitance: 220pF  (hidden comment: *)
Capacitor, Ceramic (MLCC), 220pF, ±2%, 50V, NP0, ±2%, SMD 0402; Manufacturer: Walsin Tech Corp; Manufacturer Part Number: 0402N221G500CT; Package Size: 0402; JLCPCB Basic Part: No; JLCPCB Part Number: C458858; Supplier 1: LCSC; Category: Capacitors - MLCC; Supplier Part Number 1: C458858; Tolerance: ±2%; Voltage Rating: 50V; Temperature Coefficient: NP0; RoHS: Yes; ComponentLink1Description: Datasheet; ComponentLink1URL: https://wmsc.lcsc.com/wmsc/upload/file/pdf/v2/lcsc/2304140030_Walsin-Tech-Corp-0402N221G500CT_C458858.pdf; ComponentLink2Description: JLCPCB Part URL; ComponentLink2URL: https://jlcpcb.com/partdetail/C458858; ComponentLink3Description: LCSC Part URL; ComponentLink3URL: https://lcsc.com/product-detail/Multilayer-Ceramic-Capacitors-MLCC---SMD-SMT_Walsin-Tech-Corp-Walsin-Tech-Corp-0402N221G500CT_C458858.html
footprint CAP-0402 (0402 (1005M) Capacitor)
pins: 1, 2

## 0402N221J500CT
designator C?  Capacitance: 220pF  (hidden comment: *)
Capacitor, Ceramic (MLCC), 220pF, ±5%, 50V, NP0, ±5%, SMD 0402; Manufacturer: Walsin Tech Corp; Manufacturer Part Number: 0402N221J500CT; Package Size: 0402; JLCPCB Basic Part: No; JLCPCB Part Number: C301973; Supplier 1: LCSC; Category: Capacitors - MLCC; Supplier Part Number 1: C301973; Tolerance: ±5%; Voltage Rating: 50V; Temperature Coefficient: NP0; RoHS: Yes; ComponentLink1Description: Datasheet; ComponentLink1URL: https://wmsc.lcsc.com/wmsc/upload/file/pdf/v2/lcsc/2304140030_Walsin-Tech-Corp-0402N221J500CT_C301973.pdf; ComponentLink2Description: JLCPCB Part URL; ComponentLink2URL: https://jlcpcb.com/partdetail/C301973; ComponentLink3Description: LCSC Part URL; ComponentLink3URL: https://lcsc.com/product-detail/Multilayer-Ceramic-Capacitors-MLCC---SMD-SMT_Walsin-Tech-Corp-Walsin-Tech-Corp-0402N221J500CT_C301973.html
footprint CAP-0402 (0402 (1005M) Capacitor)
pins: 1, 2

## 0402N240J500CT
designator C?  Capacitance: 24pF  (hidden comment: *)
Capacitor, Ceramic (MLCC), 24pF, ±5%, 50V, NP0, ±5%, SMD 0402; Manufacturer: Walsin Tech Corp; Manufacturer Part Number: 0402N240J500CT; Package Size: 0402; JLCPCB Basic Part: No; JLCPCB Part Number: C237198; Supplier 1: LCSC; Category: Capacitors - MLCC; Supplier Part Number 1: C237198; Tolerance: ±5%; Voltage Rating: 50V; Temperature Coefficient: NP0; RoHS: Yes; ComponentLink1Description: Datasheet; ComponentLink1URL: https://wmsc.lcsc.com/wmsc/upload/file/pdf/v2/lcsc/2304140030_Walsin-Tech-Corp-0402N240J500CT_C237198.pdf; ComponentLink2Description: JLCPCB Part URL; ComponentLink2URL: https://jlcpcb.com/partdetail/C237198; ComponentLink3Description: LCSC Part URL; ComponentLink3URL: https://lcsc.com/product-detail/Multilayer-Ceramic-Capacitors-MLCC---SMD-SMT_Walsin-Tech-Corp-Walsin-Tech-Corp-0402N240J500CT_C237198.html
footprint CAP-0402 (0402 (1005M) Capacitor)
pins: 1, 2

## 0402N250J500CT
designator C?  Capacitance: 25pF  (hidden comment: *)
Capacitor, Ceramic (MLCC), 25pF, ±5%, 50V, NP0, ±5%, SMD 0402; Manufacturer: Walsin Tech Corp; Manufacturer Part Number: 0402N250J500CT; Package Size: 0402; JLCPCB Basic Part: No; JLCPCB Part Number: C295971; Supplier 1: LCSC; Category: Capacitors - MLCC; Supplier Part Number 1: C295971; Tolerance: ±5%; Voltage Rating: 50V; Temperature Coefficient: NP0; RoHS: Yes; ComponentLink1Description: Datasheet; ComponentLink1URL: https://wmsc.lcsc.com/wmsc/upload/file/pdf/v2/lcsc/2304140030_Walsin-Tech-Corp-0402N250J500CT_C295971.pdf; ComponentLink2Description: JLCPCB Part URL; ComponentLink2URL: https://jlcpcb.com/partdetail/C295971; ComponentLink3Description: LCSC Part URL; ComponentLink3URL: https://lcsc.com/product-detail/Multilayer-Ceramic-Capacitors-MLCC---SMD-SMT_Walsin-Tech-Corp-Walsin-Tech-Corp-0402N250J500CT_C295971.html
footprint CAP-0402 (0402 (1005M) Capacitor)
pins: 1, 2

## 0402N270F500CT
designator C?  Capacitance: 27pF  (hidden comment: *)
Capacitor, Ceramic (MLCC), 27pF, ±1%, 50V, NP0, ±1%, SMD 0402; Manufacturer: Walsin Tech Corp; Manufacturer Part Number: 0402N270F500CT; Package Size: 0402; JLCPCB Basic Part: No; JLCPCB Part Number: C301974; Supplier 1: LCSC; Category: Capacitors - MLCC; Supplier Part Number 1: C301974; Tolerance: ±1%; Voltage Rating: 50V; Temperature Coefficient: NP0; RoHS: Yes; ComponentLink1Description: Datasheet; ComponentLink1URL: https://wmsc.lcsc.com/wmsc/upload/file/pdf/v2/lcsc/2304140030_Walsin-Tech-Corp-0402N270F500CT_C301974.pdf; ComponentLink2Description: JLCPCB Part URL; ComponentLink2URL: https://jlcpcb.com/partdetail/C301974; ComponentLink3Description: LCSC Part URL; ComponentLink3URL: https://lcsc.com/product-detail/Multilayer-Ceramic-Capacitors-MLCC---SMD-SMT_Walsin-Tech-Corp-Walsin-Tech-Corp-0402N270F500CT_C301974.html
footprint CAP-0402 (0402 (1005M) Capacitor)
pins: 1, 2

## 0402N270G500CT
designator C?  Capacitance: 27pF  (hidden comment: *)
Capacitor, Ceramic (MLCC), 27pF, ±2%, 50V, NP0, ±2%, SMD 0402; Manufacturer: Walsin Tech Corp; Manufacturer Part Number: 0402N270G500CT; Package Size: 0402; JLCPCB Basic Part: No; JLCPCB Part Number: C295972; Supplier 1: LCSC; Category: Capacitors - MLCC; Supplier Part Number 1: C295972; Tolerance: ±2%; Voltage Rating: 50V; Temperature Coefficient: NP0; RoHS: Yes; ComponentLink1Description: Datasheet; ComponentLink1URL: https://wmsc.lcsc.com/wmsc/upload/file/pdf/v2/lcsc/2304140030_Walsin-Tech-Corp-0402N270G500CT_C295972.pdf; ComponentLink2Description: JLCPCB Part URL; ComponentLink2URL: https://jlcpcb.com/partdetail/C295972; ComponentLink3Description: LCSC Part URL; ComponentLink3URL: https://lcsc.com/product-detail/Multilayer-Ceramic-Capacitors-MLCC---SMD-SMT_Walsin-Tech-Corp-Walsin-Tech-Corp-0402N270G500CT_C295972.html
footprint CAP-0402 (0402 (1005M) Capacitor)
pins: 1, 2

## 0402N270J101CT
designator C?  Capacitance: 27pF  (hidden comment: *)
Capacitor, Ceramic (MLCC), 27pF, ±5%, 100V, NP0, ±5%, SMD 0402; Manufacturer: Walsin Tech Corp; Manufacturer Part Number: 0402N270J101CT; Package Size: 0402; JLCPCB Basic Part: No; JLCPCB Part Number: C458859; Supplier 1: LCSC; Category: Capacitors - MLCC; Supplier Part Number 1: C458859; Tolerance: ±5%; Voltage Rating: 100V; Temperature Coefficient: NP0; RoHS: Yes; ComponentLink1Description: Datasheet; ComponentLink1URL: https://wmsc.lcsc.com/wmsc/upload/file/pdf/v2/lcsc/2304140030_Walsin-Tech-Corp-0402N270J101CT_C458859.pdf; ComponentLink2Description: JLCPCB Part URL; ComponentLink2URL: https://jlcpcb.com/partdetail/C458859; ComponentLink3Description: LCSC Part URL; ComponentLink3URL: https://lcsc.com/product-detail/Multilayer-Ceramic-Capacitors-MLCC---SMD-SMT_Walsin-Tech-Corp-Walsin-Tech-Corp-0402N270J101CT_C458859.html
footprint CAP-0402 (0402 (1005M) Capacitor)
pins: 1, 2

## 0402N270J250CT
designator C?  Capacitance: 27pF  (hidden comment: *)
Capacitor, Ceramic (MLCC), 27pF, ±5%, 25V, NP0, ±5%, SMD 0402; Manufacturer: Walsin Tech Corp; Manufacturer Part Number: 0402N270J250CT; Package Size: 0402; JLCPCB Basic Part: No; JLCPCB Part Number: C424826; Supplier 1: LCSC; Category: Capacitors - MLCC; Supplier Part Number 1: C424826; Tolerance: ±5%; Voltage Rating: 25V; Temperature Coefficient: NP0; RoHS: Yes; ComponentLink1Description: Datasheet; ComponentLink1URL: https://wmsc.lcsc.com/wmsc/upload/file/pdf/v2/lcsc/2304140030_Walsin-Tech-Corp-0402N270J250CT_C424826.pdf; ComponentLink2Description: JLCPCB Part URL; ComponentLink2URL: https://jlcpcb.com/partdetail/C424826; ComponentLink3Description: LCSC Part URL; ComponentLink3URL: https://lcsc.com/product-detail/Multilayer-Ceramic-Capacitors-MLCC---SMD-SMT_Walsin-Tech-Corp-Walsin-Tech-Corp-0402N270J250CT_C424826.html
footprint CAP-0402 (0402 (1005M) Capacitor)
pins: 1, 2

## 0402N270J500CT
designator C?  Capacitance: 27pF  (hidden comment: *)
Capacitor, Ceramic (MLCC), 27pF, ±5%, 50V, NP0, ±5%, SMD 0402; Manufacturer: Walsin Tech Corp; Manufacturer Part Number: 0402N270J500CT; Package Size: 0402; JLCPCB Basic Part: No; JLCPCB Part Number: C295973; Supplier 1: LCSC; Category: Capacitors - MLCC; Supplier Part Number 1: C295973; Tolerance: ±5%; Voltage Rating: 50V; Temperature Coefficient: NP0; RoHS: Yes; ComponentLink1Description: Datasheet; ComponentLink1URL: https://wmsc.lcsc.com/wmsc/upload/file/pdf/v2/lcsc/2304140030_Walsin-Tech-Corp-0402N270J500CT_C295973.pdf; ComponentLink2Description: JLCPCB Part URL; ComponentLink2URL: https://jlcpcb.com/partdetail/C295973; ComponentLink3Description: LCSC Part URL; ComponentLink3URL: https://lcsc.com/product-detail/Multilayer-Ceramic-Capacitors-MLCC---SMD-SMT_Walsin-Tech-Corp-Walsin-Tech-Corp-0402N270J500CT_C295973.html
footprint CAP-0402 (0402 (1005M) Capacitor)
pins: 1, 2

## 0402N271J500CT
designator C?  Capacitance: 270pF  (hidden comment: *)
Capacitor, Ceramic (MLCC), 270pF, ±5%, 50V, NP0, ±5%, SMD 0402; Manufacturer: Walsin Tech Corp; Manufacturer Part Number: 0402N271J500CT; Package Size: 0402; JLCPCB Basic Part: No; JLCPCB Part Number: C301975; Supplier 1: LCSC; Category: Capacitors - MLCC; Supplier Part Number 1: C301975; Tolerance: ±5%; Voltage Rating: 50V; Temperature Coefficient: NP0; RoHS: Yes; ComponentLink1Description: Datasheet; ComponentLink1URL: https://wmsc.lcsc.com/wmsc/upload/file/pdf/v2/lcsc/2304140030_Walsin-Tech-Corp-0402N271J500CT_C301975.pdf; ComponentLink2Description: JLCPCB Part URL; ComponentLink2URL: https://jlcpcb.com/partdetail/C301975; ComponentLink3Description: LCSC Part URL; ComponentLink3URL: https://lcsc.com/product-detail/Multilayer-Ceramic-Capacitors-MLCC---SMD-SMT_Walsin-Tech-Corp-Walsin-Tech-Corp-0402N271J500CT_C301975.html
footprint CAP-0402 (0402 (1005M) Capacitor)
pins: 1, 2

## 0402N300F500CT
designator C?  Capacitance: 30pF  (hidden comment: *)
Capacitor, Ceramic (MLCC), 30pF, ±1%, 50V, NP0, ±1%, SMD 0402; Manufacturer: Walsin Tech Corp; Manufacturer Part Number: 0402N300F500CT; Package Size: 0402; JLCPCB Basic Part: No; JLCPCB Part Number: C458861; Supplier 1: LCSC; Category: Capacitors - MLCC; Supplier Part Number 1: C458861; Tolerance: ±1%; Voltage Rating: 50V; Temperature Coefficient: NP0; RoHS: Yes; ComponentLink1Description: Datasheet; ComponentLink1URL: https://wmsc.lcsc.com/wmsc/upload/file/pdf/v2/lcsc/2304140030_Walsin-Tech-Corp-0402N300F500CT_C458861.pdf; ComponentLink2Description: JLCPCB Part URL; ComponentLink2URL: https://jlcpcb.com/partdetail/C458861; ComponentLink3Description: LCSC Part URL; ComponentLink3URL: https://lcsc.com/product-detail/Multilayer-Ceramic-Capacitors-MLCC---SMD-SMT_Walsin-Tech-Corp-Walsin-Tech-Corp-0402N300F500CT_C458861.html
footprint CAP-0402 (0402 (1005M) Capacitor)
pins: 1, 2

## 0402N300G500CT
designator C?  Capacitance: 30pF  (hidden comment: *)
Capacitor, Ceramic (MLCC), 30pF, ±2%, 50V, NP0, ±2%, SMD 0402; Manufacturer: Walsin Tech Corp; Manufacturer Part Number: 0402N300G500CT; Package Size: 0402; JLCPCB Basic Part: No; JLCPCB Part Number: C387978; Supplier 1: LCSC; Category: Capacitors - MLCC; Supplier Part Number 1: C387978; Tolerance: ±2%; Voltage Rating: 50V; Temperature Coefficient: NP0; RoHS: Yes; ComponentLink1Description: Datasheet; ComponentLink1URL: https://wmsc.lcsc.com/wmsc/upload/file/pdf/v2/lcsc/2304140030_Walsin-Tech-Corp-0402N300G500CT_C387978.pdf; ComponentLink2Description: JLCPCB Part URL; ComponentLink2URL: https://jlcpcb.com/partdetail/C387978; ComponentLink3Description: LCSC Part URL; ComponentLink3URL: https://lcsc.com/product-detail/Multilayer-Ceramic-Capacitors-MLCC---SMD-SMT_Walsin-Tech-Corp-Walsin-Tech-Corp-0402N300G500CT_C387978.html
footprint CAP-0402 (0402 (1005M) Capacitor)
pins: 1, 2

## 0402N300J500CT
designator C?  Capacitance: 30pF  (hidden comment: *)
Capacitor, Ceramic (MLCC), 30pF, ±5%, 50V, NP0, ±5%, SMD 0402; Manufacturer: Walsin Tech Corp; Manufacturer Part Number: 0402N300J500CT; Package Size: 0402; JLCPCB Basic Part: No; JLCPCB Part Number: C301979; Supplier 1: LCSC; Category: Capacitors - MLCC; Supplier Part Number 1: C301979; Tolerance: ±5%; Voltage Rating: 50V; Temperature Coefficient: NP0; RoHS: Yes; ComponentLink1Description: Datasheet; ComponentLink1URL: https://wmsc.lcsc.com/wmsc/upload/file/pdf/v2/lcsc/2304140030_Walsin-Tech-Corp-0402N300J500CT_C301979.pdf; ComponentLink2Description: JLCPCB Part URL; ComponentLink2URL: https://jlcpcb.com/partdetail/C301979; ComponentLink3Description: LCSC Part URL; ComponentLink3URL: https://lcsc.com/product-detail/Multilayer-Ceramic-Capacitors-MLCC---SMD-SMT_Walsin-Tech-Corp-Walsin-Tech-Corp-0402N300J500CT_C301979.html
footprint CAP-0402 (0402 (1005M) Capacitor)
pins: 1, 2

## 0402N301J500CT
designator C?  Capacitance: 300pF  (hidden comment: *)
Capacitor, Ceramic (MLCC), 300pF, ±5%, 50V, NP0, ±5%, SMD 0402; Manufacturer: Walsin Tech Corp; Manufacturer Part Number: 0402N301J500CT; Package Size: 0402; JLCPCB Basic Part: No; JLCPCB Part Number: C384801; Supplier 1: LCSC; Category: Capacitors - MLCC; Supplier Part Number 1: C384801; Tolerance: ±5%; Voltage Rating: 50V; Temperature Coefficient: NP0; RoHS: Yes; ComponentLink1Description: Datasheet; ComponentLink1URL: https://wmsc.lcsc.com/wmsc/upload/file/pdf/v2/lcsc/2304140030_Walsin-Tech-Corp-0402N301J500CT_C384801.pdf; ComponentLink2Description: JLCPCB Part URL; ComponentLink2URL: https://jlcpcb.com/partdetail/C384801; ComponentLink3Description: LCSC Part URL; ComponentLink3URL: https://lcsc.com/product-detail/Multilayer-Ceramic-Capacitors-MLCC---SMD-SMT_Walsin-Tech-Corp-Walsin-Tech-Corp-0402N301J500CT_C384801.html
footprint CAP-0402 (0402 (1005M) Capacitor)
pins: 1, 2
